# Altium footprint library hphonglib.PcbLib: 703 footprints (part 40 of 44)
Each footprint in its own frame and in the unit in brackets; x right, y up, seen from the top. Pads: shape width x height; smd on the part's side, far side on the other; paste and mask are expansions set on the pad; w line width, h text height; cw(c..) or ccw(c..) is an arc to the next point about the centre after c.
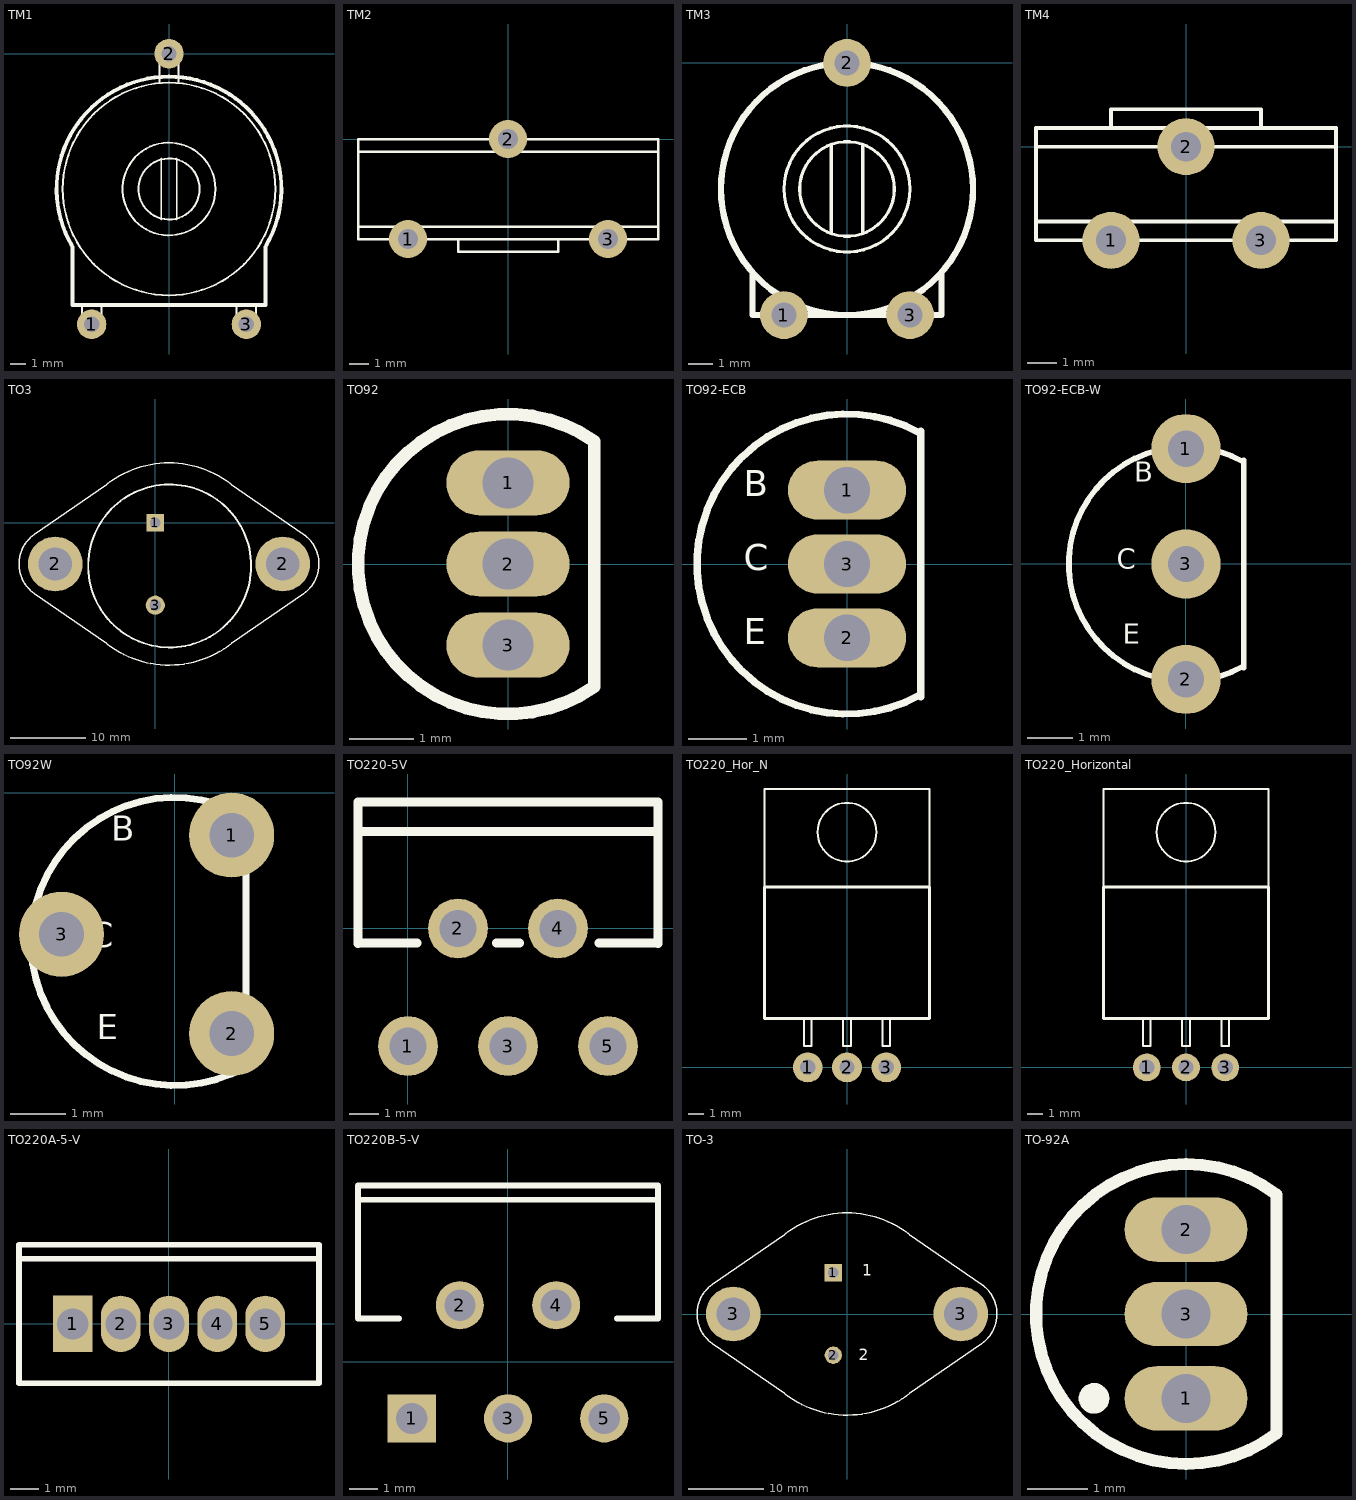
[diagram p39: the footprints below, top view; thin cyan lines are the x and y axes]

## TM1 [mil]
pads (3):
  round 76 hole 39.37 unplated: 1(-200,-700) 2(0,0) 3(200,-700)
Top Overlay:
  circle w5: c0,-350 r275
  circle w5: c0,-350 r120
  circle w5: c0,-350 r79
  lines w5: -225,-650 -225,-700 -175,-700 -175,-650 ; -25,-75 -25,0 25,0 25,-75 ; -20,-429 -20,-271 ; 20,-429 20,-271 ; 175,-650 175,-700 225,-700 225,-650
  lines w10: -251.79,-495.37 cw(c0,-350) 252.04,-494.93 ; -250,-500 -250,-650 250,-650 250,-500
Bottom Overlay:
  lines w10: -251.79,-495.37 cw(c0,-350) 252.04,-494.93 ; -250,-500 -250,-650 250,-650 250,-500

## TM2 [mil]
pads (3):
  round 76 hole 39.37 unplated: 1(-200,-200) 2(0,0) 3(200,-200)
Top Overlay:
  lines w5: -300,-175 300,-175 ; -300,-25 300,-25 ; -100,-200 -100,-225 100,-225 100,-200 ; -300,-200 300,-200 300,0 -300,0 -300,-200

## TM3 [mil]
pads (3):
  round 76 hole 39.37 unplated: 1(-100,-400) 2(0,0) 3(100,-400)
Top Overlay:
  circle w10: c0,-200 r200
  circle w5: c0,-200 r100
  circle w5: c0,-200 r75
  lines w5: -25,-270 -25,-130 ; 25,-270 25,-130
  lines w10: -150,-335 -150,-400 150,-400 150,-335
Bottom Overlay:
  circle w10: c0,-200 r200
  lines w10: -150,-335 -150,-400 150,-400 150,-335

## TM4 [mil]
pads (3):
  round 76 hole 39.37 unplated: 1(-100,-125) 2(0,0) 3(100,-125)
Top Overlay:
  lines w5: -200,-100 200,-100 ; -200,0 200,0 ; -100,25 -100,50 100,50 100,25 ; -200,-125 -200,25 200,25 200,-125 -200,-125

## TO3 [mm] "Oval Flange Mount with (2) Offset Leads; Pin Spacing 10.92 mm; Lead Dia. 1.09 mm (max)"
height 7.62
pads (4):
  rect 2.3x2.3 hole 1.4: 1(0,0)
  round 7.25 hole 4.4: 2(-13.26,-5.46) 2(16.89,-5.46)
  round 2.54 hole 1.524: 3(0,-10.92)
Top Overlay:
  circle w0.254: c1.905,-5.715 r10.795
  lines w0.2: -16.025,-9.39 -6.484,-15.981 ; -16.025,-1.52 -6.484,5.061 ; -16.013,-9.392 cw(c-13.26,-5.46) -16.013,-1.528 ; -6.798,-15.725 ccw(c1.815,-5.46) 10.113,-15.981 19.635,-9.4 ; -6.798,4.805 cw(c1.815,-5.46) 10.428,4.805 ; 10.114,5.061 19.495,-1.43 ; 19.504,-1.434 cw(c16.89,-5.46) 19.643,-9.392

## TO92 [mil] "TO, Flat Index; 3 In-Line, Axial Leads; Body Dia. 4.6mm; Leads 0.53 x 0.39 mm (max)"
pads (3):
  oval 76x40 hole 31.5: 1(0,50) 2(0,0) 3(0,-50)
Top Overlay:
  lines w7.87: 53.15,-75.59 cw(c0,0) 53.15,75.59 53.15,-75.59
Bottom Overlay:
  lines w7.87: 53.15,-75.59 cw(c0,0) 53.15,75.59 53.15,-75.59
3D body: height 196.85, standoff -39.37, extent -11.76,-62.99 11.76,-39.42
3D body: height 196.85, standoff -39.37, extent -10.78,-11.81 12.75,11.76
3D body: height 196.85, standoff -39.37, extent -11.76,37.4 11.76,60.98
3D body: height 314.96, standoff 157.48, extent -88.58,-88.58 49.21,88.58

## TO92-ECB [mil] "C1815"
pads (3):
  oval 80x40 hole 31.49 unplated: 1(0,50) 2(0,-50) 3(0,0)
Top Overlay:
  lines w5: 49.1,-88.94 cw(c0,0) 49.1,88.94 ; 50,-90 50,90
  text "E" at -70,-60 h30
  text "B" at -70,40 h30
  text "C" at -70,-10 h30
Bottom Overlay:
  lines w5: 49.1,-88.94 cw(c0,0) 49.1,88.94 ; 50,-90 50,90
3D body: height 196.85, standoff -39.37, extent -12.75,-63.98 10.78,-40.4
3D body: height 196.85, standoff -39.37, extent -11.76,-12.8 11.76,10.78
3D body: height 196.85, standoff -39.37, extent -12.75,36.42 10.78,59.99
3D body: height 314.96, standoff 157.48, extent -89.57,-89.57 48.23,87.6

## TO92-ECB-W [mil] "C1815"
pads (3):
  round 60 hole 31.49 unplated: 1(0,100) 2(0,-100) 3(0,0)
Top Overlay:
  lines w5: 49.1,-88.94 cw(c0,0) 49.1,88.94 ; 50,-90 50,90
  text "C" at -60,-10 h30
  text "B" at -45,65 h30
  text "E" at -55,-75 h30
Bottom Overlay:
  lines w5: 49.1,-88.94 cw(c0,0) 49.1,88.94 ; 50,-90 50,90
3D body: height 196.85, standoff -39.37, extent -10.83,-111.2 12.7,-87.62
3D body: height 196.85, standoff -39.37, extent -11.76,-12.8 11.76,10.78
3D body: height 196.85, standoff -39.37, extent -10.83,88.61 12.7,112.18
3D body: height 314.96, standoff 157.48, extent -89.57,-89.57 48.23,87.6

## TO92W [mil]
pads (3):
  round 60 hole 31.49 unplated: 1(40,-30) 2(40,-170) 3(-80,-100)
Top Overlay:
  lines w5: 49.1,-193.94 cw(c0,-105) 49.1,-16.06 ; 50,-195 50,-15
  text "E" at -55,-180 h30
  text "B" at -45,-40 h30
  text "C" at -60,-115 h30
Bottom Overlay:
  lines w5: 49.1,-193.94 cw(c0,-105) 49.1,-16.06 ; 50,-195 50,-15
3D body: height 314.96, standoff 157.48, extent -89.57,-194.57 48.23,-17.4
3D body: height 196.85, standoff -39.37, extent -10.83,-16.39 12.7,7.18
3D body: height 196.85, standoff -39.37, extent -11.76,-117.8 11.76,-94.22
3D body: height 196.85, standoff -39.37, extent -10.83,-216.2 12.7,-192.62

## TO220-5V [mil] "TO220 5-lead, molded, stagger bend package."
height 708.66
pads (5):
  round 80 hole 50: 1(0,-157.48) 2(66.93,0) 3(133.86,-157.48) 4(200.79,0) 5(267.72,-157.48)
Top Overlay:
  lines w12: -66.93,-20.08 -66.93,129.92 ; -66.93,-19.68 11.81,-19.68 ; -66.93,129.29 -66.93,169.29 ; -65.35,129.92 334.65,129.92 334.65,-20.08 ; -65.35,169.29 334.65,169.29 334.65,129.29 ; 118.11,-19.68 149.61,-19.68 ; 255.91,-19.68 334.65,-19.68

## TO220_Hor_N [mil] "TO, Thru-Hole, Horizontal Heatsink Mounted; 3 In-Line Leads; Pitch 2.54 mm"
height 763.78
pads (3):
  round 76 hole 39.37: 1(-100,0) 2(0,0) 3(100,0)
Top Overlay:
  circle w5: c0,600 r75
  lines w5: -210,460 -210,710 210,710 210,460 ; -110,125 -110,55 -90,55 -90,125 ; -10,125 -10,55 10,55 10,125 ; 90,125 90,55 110,55 110,125
  lines w7.87: -210,125 -210,460 210,460 210,125 -210,125
Bottom Overlay:
  lines w3.94: -157.48,-55.12 -157.48,57.09 160.43,57.09 160.43,-55.12 -157.48,-55.12
3D body: height 165.35, standoff -118.11, extent -201,-12 199,755.32

## TO220_Horizontal [mm] "TO, Thru-Hole, Horizontal Heatsink Mounted; 3 In-Line Leads; Pitch 2.54 mm"
height 19.4
pads (3):
  round 1.8 hole 1: 1(-2.54,0) 2(0,0) 3(2.54,0)
Top Overlay:
  circle w0.127: c0,15.24 r1.905
  lines w0.127: -5.334,11.684 -5.334,18.034 5.334,18.034 5.334,11.684 ; -2.794,3.175 -2.794,1.397 -2.286,1.397 -2.286,3.175 ; -0.254,3.175 -0.254,1.397 0.254,1.397 0.254,3.175 ; 2.286,3.175 2.286,1.397 2.794,1.397 2.794,3.175
  lines w0.2: -5.334,3.175 5.334,3.175 5.334,11.684 -5.334,11.684 -5.334,3.175
Bottom Overlay:
  lines w0.1: -4,-1.4 4.075,-1.4 4.075,1.45 -4,1.45 -4,-1.4
3D body: height 1.4, standoff 0.1, extent -5.075,11.575 0,17.9
3D body: height 1.4, standoff 0.1, extent 0,11.575 5.1,17.9
3D body: height 4.5, standoff 0.1, extent -5.075,3.325 5.075,11.7

## TO220A-5-V [mm] "TO, Thru-Hole, Vertical, Heatsink Mounted; 5 In-Line Leads; Pitch 1.70 mm"
height 15.3
pads (5):
  rect 1.4x2 hole 1.1: 1(-3.4,0)
  oval 1.4x2 hole 1.1: 2(-1.7,0) 3(0,0) 4(1.7,0) 5(3.4,0)
Top Overlay:
  lines w0.2: -5.3,2.3 5.3,2.3 ; -5.3,-2.1 -5.3,2.8 5.3,2.8 5.3,-2.1 -5.3,-2.1

## TO220B-5-V [mm] "TO, Thru-Hole, Vertical, Heatsink Mounted; 5 Bent Staggered Leads; Pitch 1.7 mm"
height 21.1
pads (5):
  rect 1.7x1.7 hole 1.1: 1(-3.4,-2)
  round 1.7 hole 1.1: 2(-1.7,2) 3(0,-2) 4(1.7,2) 5(3.4,-2)
Top Overlay:
  lines w0.2: -5.3,5.73 5.3,5.73 ; -3.854,1.53 -5.3,1.53 -5.3,6.23 5.3,6.23 5.3,1.53 3.854,1.53
3D body: height 21.35, standoff -2.64, extent -5.08,-2 5.08,6.24

## TO-3 [mm] "Oval Flange Mount with (2) Offset Leads; Pin Spacing 10.92 mm; Lead Dia. 1.06 mm (max)"
height 8.38
pads (4):
  rect 2.3x2.3 hole 1.4: 1(-1.815,5.46)
  round 2.3 hole 1.4: 2(-1.815,-5.46)
  round 7.25 hole 4.4: 3(-15.075,0) 3(15.075,0)
Top Overlay:
  lines w0.2: -17.84,-3.93 -8.299,-10.521 ; -17.84,3.94 -8.299,10.521 ; -17.828,-3.932 cw(c-15.075,0) -17.828,3.932 ; -8.613,-10.265 ccw(c0,0) 8.298,-10.521 17.82,-3.94 ; -8.613,10.265 cw(c0,0) 8.613,10.265 ; 8.299,10.521 17.68,4.03 ; 17.689,4.026 cw(c15.075,0) 17.828,-3.932
  text "1" at 2.032,5.08 h1.5
  text "2" at 1.524,-6.096 h1.5
3D body: height 8.69, standoff -10.91, extent -19.298,-12.475 19.502,12.525

## TO-92A [mil] "TO, Flat Index; 3 In-Line, Axial Leads; Body Dia. 4.5mm; Leads 0.51 x 0.48 mm (max); ECB Position"
height 270.08
pads (3):
  oval 80x42 hole 32: 1(0,-55) 2(0,55) 3(0,0)
Top Overlay:
  circle w10: c-60,-55 r5
  lines w7.87: 59.06,-77.95 cw(c0,0) 59.06,77.95 59.05,-77.95
3D body: height 214.96, standoff -218.11, extent -93.49,-94.48 61.24,94.5